# Altium footprint library SBCLib.PcbLib: 120 footprints (part 7 of 8)
Each footprint in its own frame and in the unit in brackets; x right, y up, seen from the top. Pads: shape width x height; smd on the part's side, far side on the other; paste and mask are expansions set on the pad; w line width, h text height; cw(c..) or ccw(c..) is an arc to the next point about the centre after c.
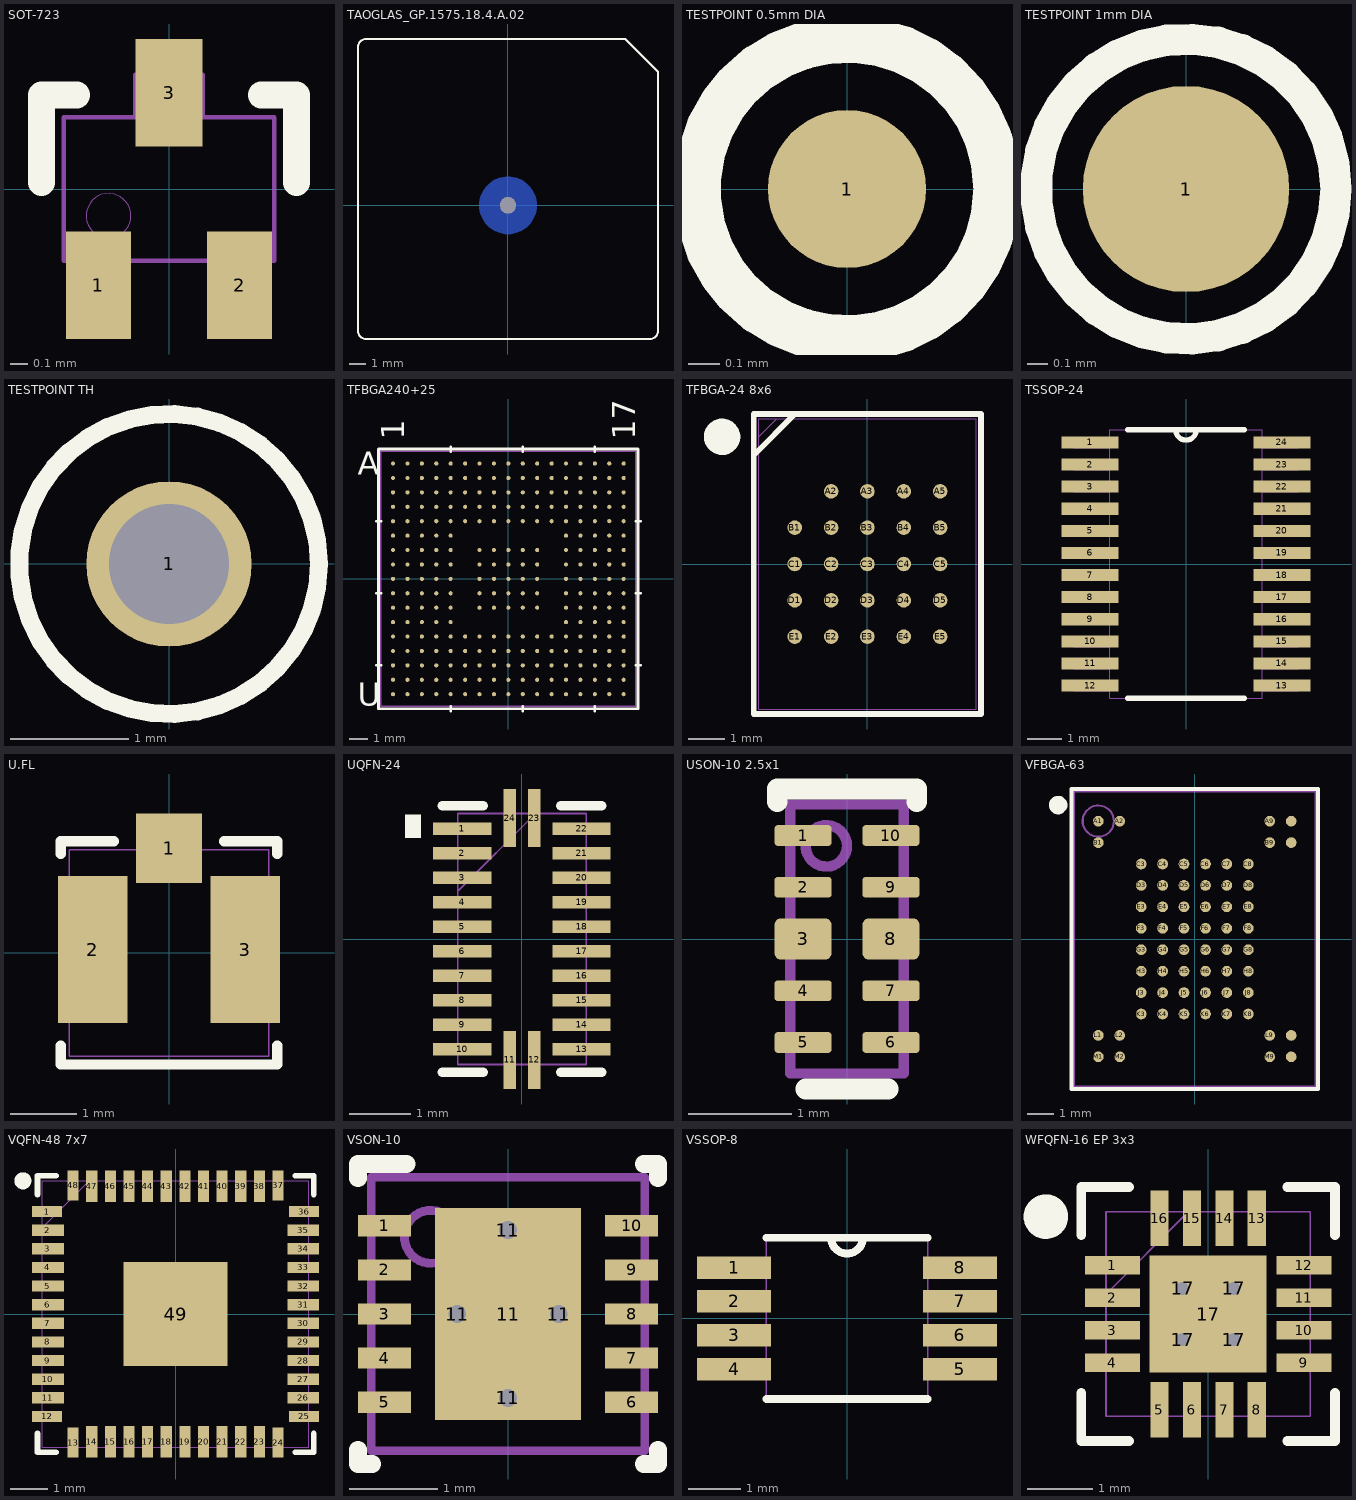
[diagram p6: the footprints below, top view; thin cyan lines are the x and y axes]

## SOT-723 [mil]
pads (3):
  rect 14.57x24 smd paste+0: 1(-15.75,-21.5) 2(15.75,-21.5)
  rect 15x24 smd paste+0: 3(0,21.5)
Top Overlay:
  lines w6: -28.5,1.41 -28.5,21 -20.6,21 ; 20.6,21 28.5,21 28.5,1.41
Mechanical 3:
  circle w0: c-13.5,-6 r5
  lines w1: -23.5,-16 -23.5,16 23.5,16 23.5,-16 -23.5,-16 ; -21.25,-25.5 -10.25,-25.5 -10.25,-16 -21.25,-16 -21.25,-25.5 ; -7.5,16 -7.5,25.5 7.5,25.5 7.5,16 -7.5,16 ; 10.25,-25.5 21.25,-25.5 21.25,-16 10.25,-16 10.25,-25.5
3D body "TRANS_RUM001_ROM.step": height 24.09, standoff 0, extent -23.49,-25.5 23.51,25.52

## TAOGLAS_GP.1575.18.4.A.02 [mm]
pads (1):
  round 0 / inner round 0 / far side round 2.54 hole 1 unplated: 1(0,0)
Bottom Layer:
  pour cut-out: 0,-1.75 0.172,-1.75 0.51,-1.683 0.829,-1.551 1.116,-1.359 1.359,-1.116 1.551,-0.829 1.683,-0.51 1.75,-0.172 1.75,0 1.75,0.172 1.683,0.51 1.551,0.829 1.359,1.116 1.116,1.359 0.829,1.551 0.51,1.683 0.172,1.75 0,1.75 -0.172,1.75 -0.51,1.683 -0.829,1.551 -1.116,1.359 -1.359,1.116 -1.551,0.829 -1.683,0.51 -1.75,0.172 -1.75,0 -1.75,-0.172 -1.683,-0.51 -1.551,-0.829 -1.359,-1.116 -1.116,-1.359 -0.829,-1.551 -0.51,-1.683 -0.172,-1.75
Top Overlay:
  lines w0.127: -9.15,-7.65 ccw(c-8.65,-7.65) -8.65,-8.15 8.65,-8.15 ccw(c8.65,-7.65) 9.15,-7.65 9.15,8.15 7.15,10.15 -8.65,10.15 ccw(c-8.65,9.65) -9.15,9.65 -9.15,-7.65
Top Solder:
  region: 0,-0.686 -0.068,-0.686 -0.2,-0.659 -0.325,-0.608 -0.437,-0.533 -0.533,-0.437 -0.608,-0.325 -0.659,-0.2 -0.686,-0.068 -0.686,0 -0.686,0.068 -0.659,0.2 -0.608,0.325 -0.533,0.437 -0.437,0.533 -0.325,0.608 -0.2,0.659 -0.068,0.686 0,0.686 0.068,0.686 0.2,0.659 0.325,0.608 0.437,0.533 0.533,0.437 0.608,0.325 0.659,0.2 0.686,0.068 0.686,0 0.686,-0.068 0.659,-0.2 0.608,-0.325 0.533,-0.437 0.437,-0.533 0.325,-0.608 0.2,-0.659 0.068,-0.686
Mechanical 3:
  circle w0.051: c0,0 r0.475
  lines w0.102: -9.15,-7.65 ccw(c-8.65,-7.65) -8.65,-8.15 8.65,-8.15 ccw(c8.65,-7.65) 9.15,-7.65 9.15,8.15 7.15,10.15 -8.65,10.15 ccw(c-8.65,9.65) -9.15,9.65 -9.15,-7.65
Multi-Layer:
  pour cut-out: -1.5,0 -1.5,-0.148 -1.442,-0.438 -1.329,-0.711 -1.165,-0.956 -0.956,-1.165 -0.711,-1.329 -0.438,-1.442 -0.148,-1.5 0,-1.5 0.148,-1.5 0.438,-1.442 0.711,-1.329 0.956,-1.165 1.165,-0.956 1.329,-0.711 1.442,-0.438 1.5,-0.148 1.5,0 1.5,0.148 1.442,0.438 1.329,0.711 1.165,0.956 0.956,1.165 0.711,1.329 0.438,1.442 0.148,1.5 0,1.5 -0.148,1.5 -0.438,1.442 -0.711,1.329 -0.956,1.165 -1.165,0.956 -1.329,0.711 -1.442,0.438 -1.5,0.148
3D body "GP.1575.18.4.A.02 v3.step": height 4.51, standoff 0, extent -9,-8 9,10

## TESTPOINT 0.5mm DIA [mm]
pads (1):
  round 0.5 smd paste-10: 1(0,0)
Top Overlay:
  circle w0.15: c0,0 r0.475

## TESTPOINT 1mm DIA [mm]
pads (1):
  round 1 smd paste-10: 1(0,0)
Top Overlay:
  circle w0.152: c0,0 r0.727

## TESTPOINT TH [mm]
pads (1):
  round 1.4 hole 1.02 paste-10: 1(0,0)
Top Overlay:
  circle w0.152: c0,0 r1.27
3D body "keystone-PN5002.STEP": height 4.57, standoff -3.05, extent -1.27,-1.27 1.27,1.27

## TFBGA240+25 [mil]
pads (265):
  round 9 smd paste+0.5 mask+3: A1(-251.97,251.97) A2(-220.47,251.97) A3(-188.98,251.97) A4(-157.48,251.97) A5(-125.98,251.97) A6(-94.49,251.97) A7(-62.99,251.97) A8(-31.5,251.97) A9(0,251.97) A10(31.5,251.97) A11(62.99,251.97) A12(94.49,251.97) A13(125.98,251.97) A14(157.48,251.97) A15(188.98,251.97) A16(220.47,251.97) A17(251.97,251.97) B1(-251.97,220.47) B2(-220.47,220.47) B3(-188.98,220.47) B4(-157.48,220.47) B5(-125.98,220.47) B6(-94.49,220.47) B7(-62.99,220.47) B8(-31.5,220.47) B9(0,220.47) B10(31.5,220.47) B11(62.99,220.47) B12(94.49,220.47) B13(125.98,220.47) B14(157.48,220.47) B15(188.98,220.47) B16(220.47,220.47) B17(251.97,220.47) C1(-251.97,188.98) C2(-220.47,188.98) C3(-188.98,188.98) C4(-157.48,188.98) C5(-125.98,188.98) C6(-94.49,188.98) C7(-62.99,188.98) C8(-31.5,188.98) C9(0,188.98) C10(31.5,188.98) C11(62.99,188.98) C12(94.49,188.98) C13(125.98,188.98) C14(157.48,188.98) C15(188.98,188.98) C16(220.47,188.98) C17(251.97,188.98) D1(-251.97,157.48) D2(-220.47,157.48) D3(-188.98,157.48) D4(-157.48,157.48) D5(-125.98,157.48) D6(-94.49,157.48) D7(-62.99,157.48) D8(-31.5,157.48) D9(0,157.48) D10(31.5,157.48) D11(62.99,157.48) D12(94.49,157.48) D13(125.98,157.48) D14(157.48,157.48) D15(188.98,157.48) D16(220.47,157.48) D17(251.97,157.48) E1(-251.97,125.98) E2(-220.47,125.98) E3(-188.98,125.98) E4(-157.48,125.98) E5(-125.98,125.98) E6(-94.49,125.98) E7(-62.99,125.98) E8(-31.5,125.98) E9(0,125.98) E10(31.5,125.98) E11(62.99,125.98) E12(94.49,125.98) E13(125.98,125.98) E14(157.48,125.98) E15(188.98,125.98) E16(220.47,125.98) E17(251.97,125.98) F1(-251.97,94.49) F2(-220.47,94.49) F3(-188.98,94.49) F4(-157.48,94.49) F5(-125.98,94.49) F13(125.98,94.49) F14(157.48,94.49) F15(188.98,94.49) F16(220.47,94.49) F17(251.97,94.49) G1(-251.97,62.99) G2(-220.47,62.99) G3(-188.98,62.99) G4(-157.48,62.99) G5(-125.98,62.99) G7(-62.99,62.99) G8(-31.5,62.99) G9(0,62.99) G10(31.5,62.99) G11(62.99,62.99) G13(125.98,62.99) G14(157.48,62.99) G15(188.98,62.99) G16(220.47,62.99) G17(251.97,62.99) H1(-251.97,31.5) H2(-220.47,31.5) H3(-188.98,31.5) H4(-157.48,31.5) H5(-125.98,31.5) H7(-62.99,31.5) H8(-31.5,31.5) H9(0,31.5) H10(31.5,31.5) H11(62.99,31.5) H13(125.98,31.5) H14(157.48,31.5) H15(188.98,31.5) H16(220.47,31.5) H17(251.97,31.5) J1(-251.97,0) J2(-220.47,0) J3(-188.98,0) J4(-157.48,0) J5(-125.98,0) J7(-62.99,0) J8(-31.5,0) J9(0,0) J10(31.5,0) J11(62.99,0) J13(125.98,0) J14(157.48,0) J15(188.98,0) J16(220.47,0) J17(251.97,0) K1(-251.97,-31.5) K2(-220.47,-31.5) K3(-188.98,-31.5) K4(-157.48,-31.5) K5(-125.98,-31.5) K7(-62.99,-31.5) K8(-31.5,-31.5) K9(0,-31.5) K10(31.5,-31.5) K11(62.99,-31.5) K13(125.98,-31.5) K14(157.48,-31.5) K15(188.98,-31.5) K16(220.47,-31.5) K17(251.97,-31.5) L1(-251.97,-62.99) L2(-220.47,-62.99) L3(-188.98,-62.99) L4(-157.48,-62.99) L5(-125.98,-62.99) L7(-62.99,-62.99) L8(-31.5,-62.99) L9(0,-62.99) L10(31.5,-62.99) L11(62.99,-62.99) L13(125.98,-62.99) L14(157.48,-62.99) L15(188.98,-62.99) L16(220.47,-62.99) L17(251.97,-62.99) M1(-251.97,-94.49) M2(-220.47,-94.49) M3(-188.98,-94.49) M4(-157.48,-94.49) M5(-125.98,-94.49) M13(125.98,-94.49) M14(157.48,-94.49) M15(188.98,-94.49) M16(220.47,-94.49) M17(251.97,-94.49) N1(-251.97,-125.98) N2(-220.47,-125.98) N3(-188.98,-125.98) N4(-157.48,-125.98) N5(-125.98,-125.98) N6(-94.49,-125.98) N7(-62.99,-125.98) N8(-31.5,-125.98) N9(0,-125.98) N10(31.5,-125.98) N11(62.99,-125.98) N12(94.49,-125.98) N13(125.98,-125.98) N14(157.48,-125.98) N15(188.98,-125.98) N16(220.47,-125.98) N17(251.97,-125.98) P1(-251.97,-157.48) P2(-220.47,-157.48) P3(-188.98,-157.48) P4(-157.48,-157.48) P5(-125.98,-157.48) P6(-94.49,-157.48) P7(-62.99,-157.48) P8(-31.5,-157.48) P9(0,-157.48) P10(31.5,-157.48) P11(62.99,-157.48) P12(94.49,-157.48) P13(125.98,-157.48) P14(157.48,-157.48) P15(188.98,-157.48) P16(220.47,-157.48) P17(251.97,-157.48) R1(-251.97,-188.98) R2(-220.47,-188.98) R3(-188.98,-188.98) R4(-157.48,-188.98) R5(-125.98,-188.98) R6(-94.49,-188.98) R7(-62.99,-188.98) R8(-31.5,-188.98) R9(0,-188.98) R10(31.5,-188.98) R11(62.99,-188.98) R12(94.49,-188.98) R13(125.98,-188.98) R14(157.48,-188.98) R15(188.98,-188.98) R16(220.47,-188.98) R17(251.97,-188.98) T1(-251.97,-220.47) T2(-220.47,-220.47) T3(-188.98,-220.47) T4(-157.48,-220.47) T5(-125.98,-220.47) T6(-94.49,-220.47) T7(-62.99,-220.47) T8(-31.5,-220.47) T9(0,-220.47) T10(31.5,-220.47) T11(62.99,-220.47) T12(94.49,-220.47) T13(125.98,-220.47) T14(157.48,-220.47) T15(188.98,-220.47) T16(220.47,-220.47) T17(251.97,-220.47) U1(-251.97,-251.97) U2(-220.47,-251.97) U3(-188.98,-251.97) U4(-157.48,-251.97) U5(-125.98,-251.97) U6(-94.49,-251.97) U7(-62.99,-251.97) U8(-31.5,-251.97) U9(0,-251.97) U10(31.5,-251.97) U11(62.99,-251.97) U12(94.49,-251.97) U13(125.98,-251.97) U14(157.48,-251.97) U15(188.98,-251.97) U16(220.47,-251.97) U17(251.97,-251.97)
Top Overlay:
  lines w6: -288.5,-188.98 -278.5,-188.98 ; -288.5,-31.5 -278.5,-31.5 ; -288.5,125.98 -278.5,125.98 ; -125.98,-288.5 -125.98,-278.5 ; -125.98,278.5 -125.98,288.5 ; 31.5,-288.5 31.5,-278.5 ; 31.5,278.5 31.5,288.5 ; 188.98,-288.5 188.98,-278.5 ; 188.98,278.5 188.98,288.5 ; 278.5,-188.98 288.5,-188.98 ; 278.5,-31.5 288.5,-31.5 ; 278.5,125.98 288.5,125.98 ; -283.5,-283.5 283.5,-283.5 283.5,283.5 -283.5,283.5 -283.5,-283.5
  text "A" at -328.5,226.97 h50
  text "U" at -328.5,-276.97 h50
  text "1" at -226.97,303.5 h50
  text "17" at 276.97,303.5 h50
Mechanical 3:
  lines w3: -278.5,-278.5 -278.5,278.51 278.51,278.51 278.51,-278.5 -278.5,-278.5
  text "17" at 276.97,303.5 h50
  text "1" at -226.97,303.5 h50
  text "A" at -328.5,226.97 h50
  text "U" at -328.5,-276.97 h50
3D body "TFBGA240+25.step": height 43.43, standoff -0.01, extent -278.5,-278.5 278.51,278.51

## TFBGA-24 8x6 [mm]
pads (24):
  round 0.4 smd paste+0: A2(-1,2) A3(0,2) A4(1,2) A5(2,2) B1(-2,1) B2(-1,1) B3(0,1) B4(1,1) B5(2,1) C1(-2,0) C2(-1,0) C3(0,0) C4(1,0) C5(2,0) D1(-2,-1) D2(-1,-1) D3(0,-1) D4(1,-1) D5(2,-1) E1(-2,-2) E2(-1,-2) E3(0,-2) E4(1,-2) E5(2,-2)
Top Overlay:
  circle w0.5: c-4,3.5 r0.25
  lines w0.152: -3.124,3.003 -2,4.127 -2.127,4 ; -3.124,-4.127 -3.124,4.127 3.124,4.127 3.124,-4.127 -3.124,-4.127
Mechanical 3:
  lines w0.025: -2.997,3.501 -2.497,4 ; -2.997,-4 -2.997,4 2.997,4 2.997,-4 -2.997,-4
3D body "FAB024_SPA.step": height 1.2, standoff 0, extent -2.997,-4 2.997,4

## TSSOP-24 [mil]
pads (24):
  rect 66x14 smd: 1(-111,140.75) 2(-111,115.16) 3(-111,89.57) 4(-111,63.98) 5(-111,38.39) 6(-111,12.8) 7(-111,-12.8) 8(-111,-38.39) 9(-111,-63.98) 10(-111,-89.57) 11(-111,-115.16) 12(-111,-140.75) 13(111,-140.75) 14(111,-115.16) 15(111,-89.57) 16(111,-63.98) 17(111,-38.39) 18(111,-12.8) 19(111,12.8) 20(111,38.39) 21(111,63.98) 22(111,89.57) 23(111,115.16) 24(111,140.75)
Top Overlay:
  lines w6: -67.44,-155.5 67.44,-155.5 ; -67.44,155.5 67.44,155.5 ; -12,155.5 ccw(c0,155.5) 12,155.5
Mechanical 3:
  lines w0: -12,155.5 ccw(c0,155.5) 12,155.5
  lines w1: -130,-146.75 -88.5,-146.75 -88.5,-134.75 -130,-134.75 -130,-146.75 ; -130,-121.16 -88.5,-121.16 -88.5,-109.16 -130,-109.16 -130,-121.16 ; -130,-95.57 -88.5,-95.57 -88.5,-83.57 -130,-83.57 -130,-95.57 ; -130,-69.98 -88.5,-69.98 -88.5,-57.98 -130,-57.98 -130,-69.98 ; -130,-44.39 -88.5,-44.39 -88.5,-32.39 -130,-32.39 -130,-44.39 ; -130,-18.8 -88.5,-18.8 -88.5,-6.8 -130,-6.8 -130,-18.8 ; -130,6.8 -88.5,6.8 -88.5,18.8 -130,18.8 -130,6.8 ; -130,32.39 -88.5,32.39 -88.5,44.39 -130,44.39 -130,32.39 ; -130,57.98 -88.5,57.98 -88.5,69.98 -130,69.98 -130,57.98 ; -130,83.57 -88.5,83.57 -88.5,95.57 -130,95.57 -130,83.57 ; -130,109.16 -88.5,109.16 -88.5,121.16 -130,121.16 -130,109.16 ; -130,134.75 -88.5,134.75 -88.5,146.75 -130,146.75 -130,134.75 ; -88.5,-155.5 -88.5,155.5 88.5,155.5 88.5,-155.5 -88.5,-155.5 ; 88.5,-146.75 130,-146.75 130,-134.75 88.5,-134.75 88.5,-146.75 ; 88.5,-121.16 130,-121.16 130,-109.16 88.5,-109.16 88.5,-121.16 ; 88.5,-95.57 130,-95.57 130,-83.57 88.5,-83.57 88.5,-95.57 ; 88.5,-69.98 130,-69.98 130,-57.98 88.5,-57.98 88.5,-69.98 ; 88.5,-44.39 130,-44.39 130,-32.39 88.5,-32.39 88.5,-44.39 ; 88.5,-18.8 130,-18.8 130,-6.8 88.5,-6.8 88.5,-18.8 ; 88.5,6.8 130,6.8 130,18.8 88.5,18.8 88.5,6.8 ; 88.5,32.39 130,32.39 130,44.39 88.5,44.39 88.5,32.39 ; 88.5,57.98 130,57.98 130,69.98 88.5,69.98 88.5,57.98 ; 88.5,83.57 130,83.57 130,95.57 88.5,95.57 88.5,83.57 ; 88.5,109.16 130,109.16 130,121.16 88.5,121.16 88.5,109.16 ; 88.5,134.75 130,134.75 130,146.75 88.5,146.75 88.5,134.75
3D body "PW0024A.stp": height 44.49, standoff 0, extent -125.98,-153.54 125.99,153.55

## U.FL [mil]
pads (3):
  rect 39x41 smd: 1(0,61.98)
  rect 41x87 smd paste+0 mask+0: 2(-45.18,1.94) 3(45.18,1.94)
Top Overlay:
  lines w6: -64,-54.66 -64,-66 64,-66 64,-54.66 ; -64,58.54 -64,66 -32.6,66 ; 32.6,66 64,66 64,58.54
Mechanical 3:
  lines w1: -59,-61 59,-61 59,61 -59,61 -59,-61
3D body "c-2337019-1-a2-3d.stp": height 49.21, standoff 0, extent -59.06,-61.02 59.06,61.03

## UQFN-24 [mm] "TPD12S016"
pads (24):
  rect 0.95x0.2 smd paste-0.1: 1(-0.975,1.8) 2(-0.975,1.4) 3(-0.975,1) 4(-0.975,0.6) 5(-0.975,0.2) 6(-0.975,-0.2) 7(-0.975,-0.6) 8(-0.975,-1) 9(-0.975,-1.4) 10(-0.975,-1.8) 13(0.975,-1.8) 14(0.975,-1.4) 15(0.975,-1) 16(0.975,-0.6) 17(0.975,-0.2) 18(0.975,0.2) 19(0.975,0.6) 20(0.975,1) 21(0.975,1.4) 22(0.975,1.8)
  rect 0.2x0.95 smd paste-0.1: 11(-0.2,-1.975) 12(0.2,-1.975) 23(0.2,1.975) 24(-0.2,1.975)
Top Overlay:
  region: -1.651,2.032 -1.905,2.032 -1.905,1.651 -1.651,1.651
  lines w0.152: -1.304,-2.177 -0.633,-2.177 ; -1.304,2.177 -0.633,2.177 ; 0.633,-2.177 1.304,-2.177 ; 0.633,2.177 1.304,2.177
Top Paste:
  region: -0.5,1.9 -1.45,1.9 -1.45,1.7 -0.5,1.7
  region: -0.5,1.5 -1.45,1.5 -1.45,1.3 -0.5,1.3
  region: -0.5,1.1 -1.45,1.1 -1.45,0.9 -0.5,0.9
  region: -0.5,0.7 -1.45,0.7 -1.45,0.5 -0.5,0.5
  region: -0.5,0.3 -1.45,0.3 -1.45,0.1 -0.5,0.1
  region: -0.5,-0.1 -1.45,-0.1 -1.45,-0.3 -0.5,-0.3
  region: -0.5,-0.5 -1.45,-0.5 -1.45,-0.7 -0.5,-0.7
  region: -0.5,-0.9 -1.45,-0.9 -1.45,-1.1 -0.5,-1.1
  region: -0.5,-1.3 -1.45,-1.3 -1.45,-1.5 -0.5,-1.5
  region: -0.5,-1.7 -1.45,-1.7 -1.45,-1.9 -0.5,-1.9
  region: -0.1,-1.5 -0.3,-1.5 -0.3,-2.45 -0.1,-2.45
  region: 0.3,-1.5 0.1,-1.5 0.1,-2.45 0.3,-2.45
  region: 1.45,-1.7 0.5,-1.7 0.5,-1.9 1.45,-1.9
  region: 1.45,-1.3 0.5,-1.3 0.5,-1.5 1.45,-1.5
  region: 1.45,-0.9 0.5,-0.9 0.5,-1.1 1.45,-1.1
  region: 1.45,-0.5 0.5,-0.5 0.5,-0.7 1.45,-0.7
  region: 1.45,-0.1 0.5,-0.1 0.5,-0.3 1.45,-0.3
  region: 1.45,0.3 0.5,0.3 0.5,0.1 1.45,0.1
  region: 1.45,0.7 0.5,0.7 0.5,0.5 1.45,0.5
  region: 1.45,1.1 0.5,1.1 0.5,0.9 1.45,0.9
  region: 1.45,1.5 0.5,1.5 0.5,1.3 1.45,1.3
  region: 1.45,1.9 0.5,1.9 0.5,1.7 1.45,1.7
  region: 0.3,2.45 0.1,2.45 0.1,1.5 0.3,1.5
  region: -0.1,2.45 -0.3,2.45 -0.3,1.5 -0.1,1.5
Top Solder:
  region: -0.5,1.9 -1.45,1.9 -1.45,1.7 -0.5,1.7
  region: -0.5,1.5 -1.45,1.5 -1.45,1.3 -0.5,1.3
  region: -0.5,1.1 -1.45,1.1 -1.45,0.9 -0.5,0.9
  region: -0.5,0.7 -1.45,0.7 -1.45,0.5 -0.5,0.5
  region: -0.5,0.3 -1.45,0.3 -1.45,0.1 -0.5,0.1
  region: -0.5,-0.1 -1.45,-0.1 -1.45,-0.3 -0.5,-0.3
  region: -0.5,-0.5 -1.45,-0.5 -1.45,-0.7 -0.5,-0.7
  region: -0.5,-0.9 -1.45,-0.9 -1.45,-1.1 -0.5,-1.1
  region: -0.5,-1.3 -1.45,-1.3 -1.45,-1.5 -0.5,-1.5
  region: -0.5,-1.7 -1.45,-1.7 -1.45,-1.9 -0.5,-1.9
  region: -0.1,-1.5 -0.3,-1.5 -0.3,-2.45 -0.1,-2.45
  region: 0.3,-1.5 0.1,-1.5 0.1,-2.45 0.3,-2.45
  region: 1.45,-1.7 0.5,-1.7 0.5,-1.9 1.45,-1.9
  region: 1.45,-1.3 0.5,-1.3 0.5,-1.5 1.45,-1.5
  region: 1.45,-0.9 0.5,-0.9 0.5,-1.1 1.45,-1.1
  region: 1.45,-0.5 0.5,-0.5 0.5,-0.7 1.45,-0.7
  region: 1.45,-0.1 0.5,-0.1 0.5,-0.3 1.45,-0.3
  region: 1.45,0.3 0.5,0.3 0.5,0.1 1.45,0.1
  region: 1.45,0.7 0.5,0.7 0.5,0.5 1.45,0.5
  region: 1.45,1.1 0.5,1.1 0.5,0.9 1.45,0.9
  region: 1.45,1.5 0.5,1.5 0.5,1.3 1.45,1.3
  region: 1.45,1.9 0.5,1.9 0.5,1.7 1.45,1.7
  region: 0.3,2.45 0.1,2.45 0.1,1.5 0.3,1.5
  region: -0.1,2.45 -0.3,2.45 -0.3,1.5 -0.1,1.5
Mechanical 3:
  lines w0.025: -1.05,0.78 0.22,2.05 ; -1.05,-2.05 1.05,-2.05 1.05,2.05 -1.05,2.05 -1.05,-2.05 ; -1.05,-1.925 -1.05,-1.675 -1.05,-1.925 ; -1.05,-1.525 -1.05,-1.275 -1.05,-1.525 ; -1.05,-1.125 -1.05,-0.875 -1.05,-1.125 ; -1.05,-0.725 -1.05,-0.475 -1.05,-0.725 ; -1.05,-0.325 -1.05,-0.075 -1.05,-0.325 ; -1.05,0.075 -1.05,0.325 -1.05,0.075 ; -1.05,0.475 -1.05,0.725 -1.05,0.475 ; -1.05,0.875 -1.05,1.125 -1.05,0.875 ; -1.05,1.275 -1.05,1.525 -1.05,1.275 ; -1.05,1.675 -1.05,1.925 -1.05,1.675 ; -0.325,-2.05 -0.075,-2.05 -0.325,-2.05 ; -0.325,2.05 -0.075,2.05 -0.325,2.05 ; 0.075,-2.05 0.325,-2.05 0.075,-2.05 ; 0.075,2.05 0.325,2.05 0.075,2.05 ; 1.05,-1.925 1.05,-1.675 1.05,-1.925 ; 1.05,-1.525 1.05,-1.275 1.05,-1.525 ; 1.05,-1.125 1.05,-0.875 1.05,-1.125 ; 1.05,-0.725 1.05,-0.475 1.05,-0.725 ; 1.05,-0.325 1.05,-0.075 1.05,-0.325 ; 1.05,0.075 1.05,0.325 1.05,0.075 ; 1.05,0.475 1.05,0.725 1.05,0.475 ; 1.05,0.875 1.05,1.125 1.05,0.875 ; 1.05,1.275 1.05,1.525 1.05,1.275 ; 1.05,1.675 1.05,1.925 1.05,1.675
3D body "RKT0024A.stp": height 0.55, standoff 0, extent -1,-2 1,2

## USON-10 2.5x1 [mm]
pads (10):
  rrect30% 0.55x0.2 smd paste+0: 1(-0.425,1) 2(-0.425,0.5) 4(-0.425,-0.5) 5(-0.425,-1) 6(0.425,-1) 7(0.425,-0.5) 9(0.425,0.5) 10(0.425,1)
  rrect30% 0.55x0.4 smd paste+0: 3(-0.425,0) 8(0.425,0)
Top Overlay:
  lines w0.2: -0.675,1.33 -0.675,1.45 -0.55,1.45 0.675,1.45 0.675,1.33 ; -0.4,-1.45 0.4,-1.45
Mechanical 3:
  circle w0.1: c-0.2,0.9 r0.2
  lines w0.1: -0.55,-1.3 0.55,-1.3 0.55,1.3 -0.55,1.3 -0.55,-1.3
3D body "DQA0010A.stp": height 0.55, standoff 0, extent -0.5,-1.25 0.5,1.25

## VFBGA-63 [mm] "TH58NVG3S0HBAI4"
pads (63):
  round 0.4 smd paste+0 mask+0.05: A1(-3.6,4.4) A2(-2.8,4.4) A9(2.8,4.4) A10(3.6,4.4) B1(-3.6,3.6) B9(2.8,3.6) B10(3.6,3.6) C3(-2,2.8) C4(-1.2,2.8) C5(-0.4,2.8) C6(0.4,2.8) C7(1.2,2.8) C8(2,2.8) D3(-2,2) D4(-1.2,2) D5(-0.4,2) D6(0.4,2) D7(1.2,2) D8(2,2) E3(-2,1.2) E4(-1.2,1.2) E5(-0.4,1.2) E6(0.4,1.2) E7(1.2,1.2) E8(2,1.2) F3(-2,0.4) F4(-1.2,0.4) F5(-0.4,0.4) F6(0.4,0.4) F7(1.2,0.4) F8(2,0.4) G3(-2,-0.4) G4(-1.2,-0.4) G5(-0.4,-0.4) G6(0.4,-0.4) G7(1.2,-0.4) G8(2,-0.4) H3(-2,-1.2) H4(-1.2,-1.2) H5(-0.4,-1.2) H6(0.4,-1.2) H7(1.2,-1.2) H8(2,-1.2) J3(-2,-2) J4(-1.2,-2) J5(-0.4,-2) J6(0.4,-2) J7(1.2,-2) J8(2,-2) K3(-2,-2.8) K4(-1.2,-2.8) K5(-0.4,-2.8) K6(0.4,-2.8) K7(1.2,-2.8) K8(2,-2.8) L1(-3.6,-3.6) L2(-2.8,-3.6) L9(2.8,-3.6) L10(3.6,-3.6) M1(-3.6,-4.4) M2(-2.8,-4.4) M9(2.8,-4.4) M10(3.6,-4.4)
Top Overlay:
  circle w0.381: c-5.1,5 r0.152
  lines w0.152: -4.6,-5.6 -4.6,5.6 4.6,5.6 4.6,-5.6 -4.6,-5.6
Mechanical 3:
  circle w0.076: c-3.6,4.4 r0.583
  lines w0.076: -4.5,-5.5 4.5,-5.5 4.5,5.5 -4.5,5.5 -4.5,-5.5
3D body: height 1.02, standoff 0.3, extent -3.998,3.8 -3.002,4.798
3D body: height 1, standoff 0.26, extent -4.5,-5.5 4.5,5.5
3D body: height 0.46, standoff 0, extent 3.373,4.17 3.827,4.63
3D body: height 0.46, standoff 0, extent 3.374,3.37 3.827,3.83
3D body: height 0.46, standoff 0, extent 2.574,3.37 3.027,3.83
3D body: height 0.46, standoff 0, extent 2.574,4.17 3.027,4.63
3D body: height 0.46, standoff 0, extent -3.026,4.17 -2.573,4.63
3D body: height 0.46, standoff 0, extent -3.826,4.17 -3.373,4.63
3D body: height 0.46, standoff 0, extent -3.826,3.37 -3.373,3.83
3D body: height 0.46, standoff 0, extent -2.226,2.57 -1.773,3.03
3D body: height 0.46, standoff 0, extent -1.426,2.57 -0.973,3.03
3D body: height 0.46, standoff 0, extent -0.626,2.57 -0.173,3.03
3D body: height 0.46, standoff 0, extent 0.174,2.57 0.627,3.03
3D body: height 0.46, standoff 0, extent 0.974,2.57 1.427,3.03
3D body: height 0.46, standoff 0, extent 1.774,2.57 2.227,3.03
3D body: height 0.46, standoff 0, extent 1.774,1.77 2.227,2.23
3D body: height 0.46, standoff 0, extent 0.974,1.77 1.427,2.23
3D body: height 0.46, standoff 0, extent 0.174,1.77 0.627,2.23
3D body: height 0.46, standoff 0, extent -0.626,1.77 -0.173,2.23
3D body: height 0.46, standoff 0, extent -1.426,1.77 -0.973,2.23
3D body: height 0.46, standoff 0, extent -2.226,1.77 -1.773,2.23
3D body: height 0.46, standoff 0, extent 1.774,0.97 2.227,1.43
3D body: height 0.46, standoff 0, extent 0.974,0.97 1.427,1.43
3D body: height 0.46, standoff 0, extent 0.174,0.97 0.627,1.43
3D body: height 0.46, standoff 0, extent -0.626,0.97 -0.173,1.43
3D body: height 0.46, standoff 0, extent -1.426,0.97 -0.973,1.43
3D body: height 0.46, standoff 0, extent -2.226,0.97 -1.773,1.43
3D body: height 0.46, standoff 0, extent 1.774,0.17 2.227,0.63
3D body: height 0.46, standoff 0, extent 0.974,0.17 1.427,0.63
3D body: height 0.46, standoff 0, extent 0.174,0.17 0.627,0.63
3D body: height 0.46, standoff 0, extent -0.626,0.17 -0.173,0.63
3D body: height 0.46, standoff 0, extent -1.426,0.17 -0.973,0.63
3D body: height 0.46, standoff 0, extent -2.226,0.17 -1.773,0.63
3D body: height 0.46, standoff 0, extent 1.774,-0.63 2.227,-0.17
3D body: height 0.46, standoff 0, extent 0.974,-0.63 1.427,-0.17
3D body: height 0.46, standoff 0, extent 0.174,-0.63 0.627,-0.17
3D body: height 0.46, standoff 0, extent -0.626,-0.63 -0.173,-0.17
3D body: height 0.46, standoff 0, extent -1.426,-0.63 -0.973,-0.17
3D body: height 0.46, standoff 0, extent -2.226,-0.63 -1.773,-0.17
3D body: height 0.46, standoff 0, extent 1.774,-1.43 2.227,-0.97
3D body: height 0.46, standoff 0, extent 0.974,-1.43 1.427,-0.97
3D body: height 0.46, standoff 0, extent 0.174,-1.43 0.627,-0.97
3D body: height 0.46, standoff 0, extent -0.626,-1.43 -0.173,-0.97
3D body: height 0.46, standoff 0, extent -1.426,-1.43 -0.973,-0.97
3D body: height 0.46, standoff 0, extent -2.226,-1.43 -1.773,-0.97
3D body: height 0.46, standoff 0, extent 1.774,-2.23 2.227,-1.77
3D body: height 0.46, standoff 0, extent 0.974,-2.23 1.427,-1.77
3D body: height 0.46, standoff 0, extent 0.174,-2.23 0.627,-1.77
3D body: height 0.46, standoff 0, extent -0.626,-2.23 -0.173,-1.77
3D body: height 0.46, standoff 0, extent -1.426,-2.23 -0.973,-1.77
3D body: height 0.46, standoff 0, extent -2.226,-2.23 -1.773,-1.77
3D body: height 0.46, standoff 0, extent 1.774,-3.03 2.227,-2.57
3D body: height 0.46, standoff 0, extent 0.974,-3.03 1.427,-2.57
3D body: height 0.46, standoff 0, extent 0.174,-3.03 0.627,-2.57
3D body: height 0.46, standoff 0, extent -0.626,-3.03 -0.173,-2.57
3D body: height 0.46, standoff 0, extent -1.426,-3.03 -0.973,-2.57
3D body: height 0.46, standoff 0, extent -2.226,-3.03 -1.773,-2.57
3D body: height 0.46, standoff 0, extent 2.574,-3.83 3.027,-3.37
3D body: height 0.46, standoff 0, extent 2.574,-4.63 3.027,-4.17
3D body: height 0.46, standoff 0, extent 3.374,-4.63 3.827,-4.17
3D body: height 0.46, standoff 0, extent 3.373,-3.83 3.827,-3.37
3D body: height 0.46, standoff 0, extent -3.826,-3.83 -3.373,-3.37
3D body: height 0.46, standoff 0, extent -3.826,-4.63 -3.373,-4.17
3D body: height 0.46, standoff 0, extent -3.026,-4.63 -2.573,-4.17
3D body: height 0.46, standoff 0, extent -3.027,-3.83 -2.573,-3.37

## VQFN-48 7x7 [mm]
pads (49):
  rect 0.8x0.3 smd mask+0.025: 1(-3.45,2.75) 12(-3.45,-2.75) 25(3.45,-2.75) 36(3.45,2.75)
  rect 0.85x0.3 smd mask+0.025: 2(-3.425,2.25) 3(-3.425,1.75) 4(-3.425,1.25) 5(-3.425,0.75) 6(-3.425,0.25) 7(-3.425,-0.25) 8(-3.425,-0.75) 9(-3.425,-1.25) 10(-3.425,-1.75) 11(-3.425,-2.25) 26(3.425,-2.25) 27(3.425,-1.75) 28(3.425,-1.25) 29(3.425,-0.75) 30(3.425,-0.25) 31(3.425,0.25) 32(3.425,0.75) 33(3.425,1.25) 34(3.425,1.75) 35(3.425,2.25)
  rect 0.3x0.8 smd mask+0.025: 13(-2.75,-3.45) 24(2.75,-3.45) 37(2.75,3.45) 48(-2.75,3.45)
  rect 0.3x0.85 smd mask+0.025: 14(-2.25,-3.425) 15(-1.75,-3.425) 16(-1.25,-3.425) 17(-0.75,-3.425) 18(-0.25,-3.425) 19(0.25,-3.425) 20(0.75,-3.425) 21(1.25,-3.425) 22(1.75,-3.425) 23(2.25,-3.425) 38(2.25,3.425) 39(1.75,3.425) 40(1.25,3.425) 41(0.75,3.425) 42(0.25,3.425) 43(-0.25,3.425) 44(-0.75,3.425) 45(-1.25,3.425) 46(-1.75,3.425) 47(-2.25,3.425)
  rect 2.8x2.8 smd: 49(0,0)
Top Overlay:
  circle w0.254: c-4.1,3.575 r0.103
  lines w0.152: -3.708,-3.21 -3.708,-3.708 -3.21,-3.708 ; -3.708,3.21 -3.708,3.708 -3.21,3.708 ; 3.21,-3.708 3.708,-3.708 3.708,-3.21 ; 3.21,3.708 3.708,3.708 3.708,3.21
Mechanical 3:
  lines w0.025: -3.581,2.311 -2.311,3.581 ; -3.581,-3.581 -3.581,3.581 3.581,3.581 3.581,-3.581 -3.581,-3.581 ; -3.581,-2.902 -3.581,-2.598 -3.581,-2.902 ; -3.581,-2.402 -3.581,-2.098 -3.581,-2.402 ; -3.581,-1.902 -3.581,-1.598 -3.581,-1.902 ; -3.581,-1.402 -3.581,-1.098 -3.581,-1.402 ; -3.581,-0.902 -3.581,-0.598 -3.581,-0.902 ; -3.581,-0.402 -3.581,-0.098 -3.581,-0.402 ; -3.581,0.098 -3.581,0.402 -3.581,0.098 ; -3.581,0.598 -3.581,0.902 -3.581,0.598 ; -3.581,1.098 -3.581,1.402 -3.581,1.098 ; -3.581,1.598 -3.581,1.902 -3.581,1.598 ; -3.581,2.098 -3.581,2.402 -3.581,2.098 ; -3.581,2.598 -3.581,2.902 -3.581,2.598 ; -2.902,-3.581 -2.598,-3.581 -2.902,-3.581 ; -2.902,3.581 -2.598,3.581 -2.902,3.581 ; -2.402,-3.581 -2.098,-3.581 -2.402,-3.581 ; -2.402,3.581 -2.098,3.581 -2.402,3.581 ; -1.902,-3.581 -1.598,-3.581 -1.902,-3.581 ; -1.902,3.581 -1.598,3.581 -1.902,3.581 ; -1.402,-3.581 -1.098,-3.581 -1.402,-3.581 ; -1.402,3.581 -1.098,3.581 -1.402,3.581 ; -0.902,-3.581 -0.598,-3.581 -0.902,-3.581 ; -0.902,3.581 -0.598,3.581 -0.902,3.581 ; -0.402,-3.581 -0.098,-3.581 -0.402,-3.581 ; -0.402,3.581 -0.098,3.581 -0.402,3.581 ; 0.098,-3.581 0.402,-3.581 0.098,-3.581 ; 0.098,3.581 0.402,3.581 0.098,3.581 ; 0.598,-3.581 0.902,-3.581 0.598,-3.581 ; 0.598,3.581 0.902,3.581 0.598,3.581 ; 1.098,-3.581 1.402,-3.581 1.098,-3.581 ; 1.098,3.581 1.402,3.581 1.098,3.581 ; 1.598,-3.581 1.902,-3.581 1.598,-3.581 ; 1.598,3.581 1.902,3.581 1.598,3.581 ; 2.098,-3.581 2.402,-3.581 2.098,-3.581 ; 2.098,3.581 2.402,3.581 2.098,3.581 ; 2.598,-3.581 2.902,-3.581 2.598,-3.581 ; 2.598,3.581 2.902,3.581 2.598,3.581 ; 3.581,-2.902 3.581,-2.598 3.581,-2.902 ; 3.581,-2.402 3.581,-2.098 3.581,-2.402 ; 3.581,-1.902 3.581,-1.598 3.581,-1.902 ; 3.581,-1.402 3.581,-1.098 3.581,-1.402 ; 3.581,-0.902 3.581,-0.598 3.581,-0.902 ; 3.581,-0.402 3.581,-0.098 3.581,-0.402 ; 3.581,0.098 3.581,0.402 3.581,0.098 ; 3.581,0.598 3.581,0.902 3.581,0.598 ; 3.581,1.098 3.581,1.402 3.581,1.098 ; 3.581,1.598 3.581,1.902 3.581,1.598 ; 3.581,2.098 3.581,2.402 3.581,2.098 ; 3.581,2.598 3.581,2.902 3.581,2.598
3D body "VFQFPN-48_7x7x1mm_STM.step": height 0.94, standoff 0, extent -3.581,-3.581 3.581,3.581

## VSON-10 [mm]
pads (15):
  rect 0.6x0.24 smd paste+0 mask+0.051: 1(-1.4,1) 2(-1.4,0.5) 3(-1.4,0) 4(-1.4,-0.5) 5(-1.4,-1) 6(1.4,-1) 7(1.4,-0.5) 8(1.4,0) 9(1.4,0.5) 10(1.4,1)
  round 0.5 hole 0.203 mask+0.051: 11(-0.575,0) 11(0,-0.95) 11(0,0.95) 11(0.575,0)
  rect 1.65x2.4 smd paste-1.187 mask+0.051: 11(0,0)
Top Overlay:
  lines w0.2: -1.7,-1.54 -1.7,-1.7 -1.54,-1.7 ; -1.7,1.54 -1.7,1.7 -1.15,1.7 ; 1.54,-1.7 1.7,-1.7 1.7,-1.54 ; 1.54,1.7 1.7,1.7 1.7,1.54
Top Paste:
  region: -0.75,1.16 -0.75,0.1 0.75,0.1 0.75,1.16
  region: -0.75,-0.1 -0.75,-1.16 0.75,-1.16 0.75,-0.1
Mechanical 3:
  circle w0.1: c-0.875,0.875 r0.3
  lines w0.1: -1.55,-1.55 1.55,-1.55 1.55,1.55 -1.55,1.55 -1.55,-1.55
3D body "DRC0010J.stp": height 1, standoff 0, extent -1.5,-1.5 1.5,1.5

## VSSOP-8 [mil] "TPS61085"
pads (8):
  rect 56x17 smd: 1(-85.5,38.39) 2(-85.5,12.8) 3(-85.5,-12.8) 4(-85.5,-38.39) 5(85.5,-38.39) 6(85.5,-12.8) 7(85.5,12.8) 8(85.5,38.39)
Top Overlay:
  lines w6: -61,-61 61,-61 ; -61,61 61,61 ; -12,61 ccw(c0,61) 12,61
Mechanical 3:
  lines w0: -12,61 ccw(c0,61) 12,61
  lines w1: -99.5,-45.89 -99.5,-30.89 -61,-30.89 -61,-45.89 -99.5,-45.89 ; -99.5,-20.3 -99.5,-5.3 -61,-5.3 -61,-20.3 -99.5,-20.3 ; -99.5,5.3 -99.5,20.3 -61,20.3 -61,5.3 -99.5,5.3 ; -99.5,30.89 -99.5,45.89 -61,45.89 -61,30.89 -99.5,30.89 ; -61,-61 -61,61 61,61 61,-61 -61,-61 ; 61,-45.89 61,-30.89 99.5,-30.89 99.5,-45.89 61,-45.89 ; 61,-20.3 61,-5.3 99.5,-5.3 99.5,-20.3 61,-20.3 ; 61,5.3 61,20.3 99.5,20.3 99.5,5.3 61,5.3 ; 61,30.89 61,45.89 99.5,45.89 99.5,30.89 61,30.89
3D body "DGK0008A.stp": height 43.31, standoff 0, extent -96.5,-58.99 96.5,59

## WFQFN-16 EP 3x3 [mm]
pads (21):
  rect 0.85x0.28 smd paste-0.025: 1(-1.475,0.75) 2(-1.475,0.25) 3(-1.475,-0.25) 4(-1.475,-0.75) 9(1.475,-0.75) 10(1.475,-0.25) 11(1.475,0.25) 12(1.475,0.75)
  rect 0.28x0.85 smd paste-0.025: 5(-0.75,-1.475) 6(-0.25,-1.475) 7(0.25,-1.475) 8(0.75,-1.475) 13(0.75,1.475) 14(0.25,1.475) 15(-0.25,1.475) 16(-0.75,1.475)
  round 0.5 hole 0.203 paste+0: 17(-0.394,-0.394) 17(-0.394,0.394) 17(0.394,-0.394) 17(0.394,0.394)
  rect 1.803x1.803 smd paste-0.889 mask-0.889: 17(0,0)
Top Overlay:
  circle w0.381: c-2.5,1.5 r0.152
  lines w0.152: -1.956,-1.218 -1.956,-1.956 -1.218,-1.956 ; -1.956,1.218 -1.956,1.956 -1.218,1.956 ; 1.218,-1.956 1.956,-1.956 1.956,-1.218 ; 1.218,1.956 1.956,1.956 1.956,1.218
Top Paste:
  region: -0.494,0.827 -0.827,0.827 -0.827,0.494 -0.635,0.494 -0.494,0.635
  region: -0.635,0.294 -0.827,0.294 -0.827,-0.294 -0.635,-0.294 -0.494,-0.152 -0.494,0.152
  region: -0.635,-0.494 -0.827,-0.494 -0.827,-0.827 -0.494,-0.827 -0.494,-0.635
  region: 0.294,0.827 -0.294,0.827 -0.294,0.635 -0.152,0.494 0.152,0.494 0.294,0.635
  region: 0.152,0.294 -0.152,0.294 -0.294,0.152 -0.294,-0.152 -0.152,-0.294 0.152,-0.294 0.294,-0.152 0.294,0.152
  region: 0.152,-0.494 -0.152,-0.494 -0.294,-0.635 -0.294,-0.827 0.294,-0.827 0.294,-0.635
  region: 0.827,0.827 0.494,0.827 0.494,0.635 0.635,0.494 0.827,0.494
  region: 0.827,0.294 0.635,0.294 0.494,0.152 0.494,-0.152 0.635,-0.294 0.827,-0.294
  region: 0.827,-0.494 0.635,-0.494 0.494,-0.635 0.494,-0.827 0.827,-0.827
Top Solder:
  region: -0.98,0.96 -1.97,0.96 -1.97,0.54 -0.98,0.54
  region: -0.98,0.46 -1.97,0.46 -1.97,0.04 -0.98,0.04
  region: -0.98,-0.04 -1.97,-0.04 -1.97,-0.46 -0.98,-0.46
  region: -0.98,-0.54 -1.97,-0.54 -1.97,-0.96 -0.98,-0.96
  region: -0.54,-0.98 -0.96,-0.98 -0.96,-1.97 -0.54,-1.97
  region: -0.04,-0.98 -0.46,-0.98 -0.46,-1.97 -0.04,-1.97
  region: 0.46,-0.98 0.04,-0.98 0.04,-1.97 0.46,-1.97
  region: 0.96,-0.98 0.54,-0.98 0.54,-1.97 0.96,-1.97
  region: 1.97,-0.54 0.98,-0.54 0.98,-0.96 1.97,-0.96
  region: 1.97,-0.04 0.98,-0.04 0.98,-0.46 1.97,-0.46
  region: 1.97,0.46 0.98,0.46 0.98,0.04 1.97,0.04
  region: 1.97,0.96 0.98,0.96 0.98,0.54 1.97,0.54
  region: 0.96,1.97 0.54,1.97 0.54,0.98 0.96,0.98
  region: 0.46,1.97 0.04,1.97 0.04,0.98 0.46,0.98
  region: -0.04,1.97 -0.46,1.97 -0.46,0.98 -0.04,0.98
  region: -0.54,1.97 -0.96,1.97 -0.96,0.98 -0.54,0.98
  region: -0.965,0.594 -0.965,0.965 0.965,0.965 0.965,0.594
  region: -0.965,-0.194 -0.965,0.194 0.965,0.194 0.965,-0.194
  region: -0.965,-0.965 -0.965,-0.594 0.965,-0.594 0.965,-0.965
  region: -0.965,-0.965 -0.965,0.965 -0.594,0.965 -0.594,-0.965
  region: 0.194,-0.965 0.194,0.965 -0.194,0.965 -0.194,-0.965
  region: 0.594,-0.965 0.594,0.965 0.965,0.965 0.965,-0.965
Mechanical 3:
  lines w0.025: -1.575,0.305 -0.305,1.575 ; -1.575,-1.575 1.575,-1.575 1.575,1.575 -1.575,1.575 -1.575,-1.575 ; -1.575,-0.902 -1.575,-0.598 -1.575,-0.902 ; -1.575,-0.402 -1.575,-0.098 -1.575,-0.402 ; -1.575,0.098 -1.575,0.402 -1.575,0.098 ; -1.575,0.598 -1.575,0.902 -1.575,0.598 ; -0.902,-1.575 -0.598,-1.575 -0.902,-1.575 ; -0.902,1.575 -0.598,1.575 -0.902,1.575 ; -0.402,-1.575 -0.098,-1.575 -0.402,-1.575 ; -0.402,1.575 -0.098,1.575 -0.402,1.575 ; 0.098,-1.575 0.402,-1.575 0.098,-1.575 ; 0.098,1.575 0.402,1.575 0.098,1.575 ; 0.598,-1.575 0.902,-1.575 0.598,-1.575 ; 0.598,1.575 0.902,1.575 0.598,1.575 ; 1.575,-0.902 1.575,-0.598 1.575,-0.902 ; 1.575,-0.402 1.575,-0.098 1.575,-0.402 ; 1.575,0.098 1.575,0.402 1.575,0.098 ; 1.575,0.598 1.575,0.902 1.575,0.598
  text "*" at -2,1 h1.27
3D body "RTE16_1P7X1P7.step": height 0.74, standoff 0, extent -1.626,-1.626 1.626,1.626